# Altium footprint library General.PcbLib: 446 footprints (part 27 of 28)
Each footprint in its own frame and in the unit in brackets; x right, y up, seen from the top. Pads: shape width x height; smd on the part's side, far side on the other; paste and mask are expansions set on the pad; w line width, h text height; cw(c..) or ccw(c..) is an arc to the next point about the centre after c.
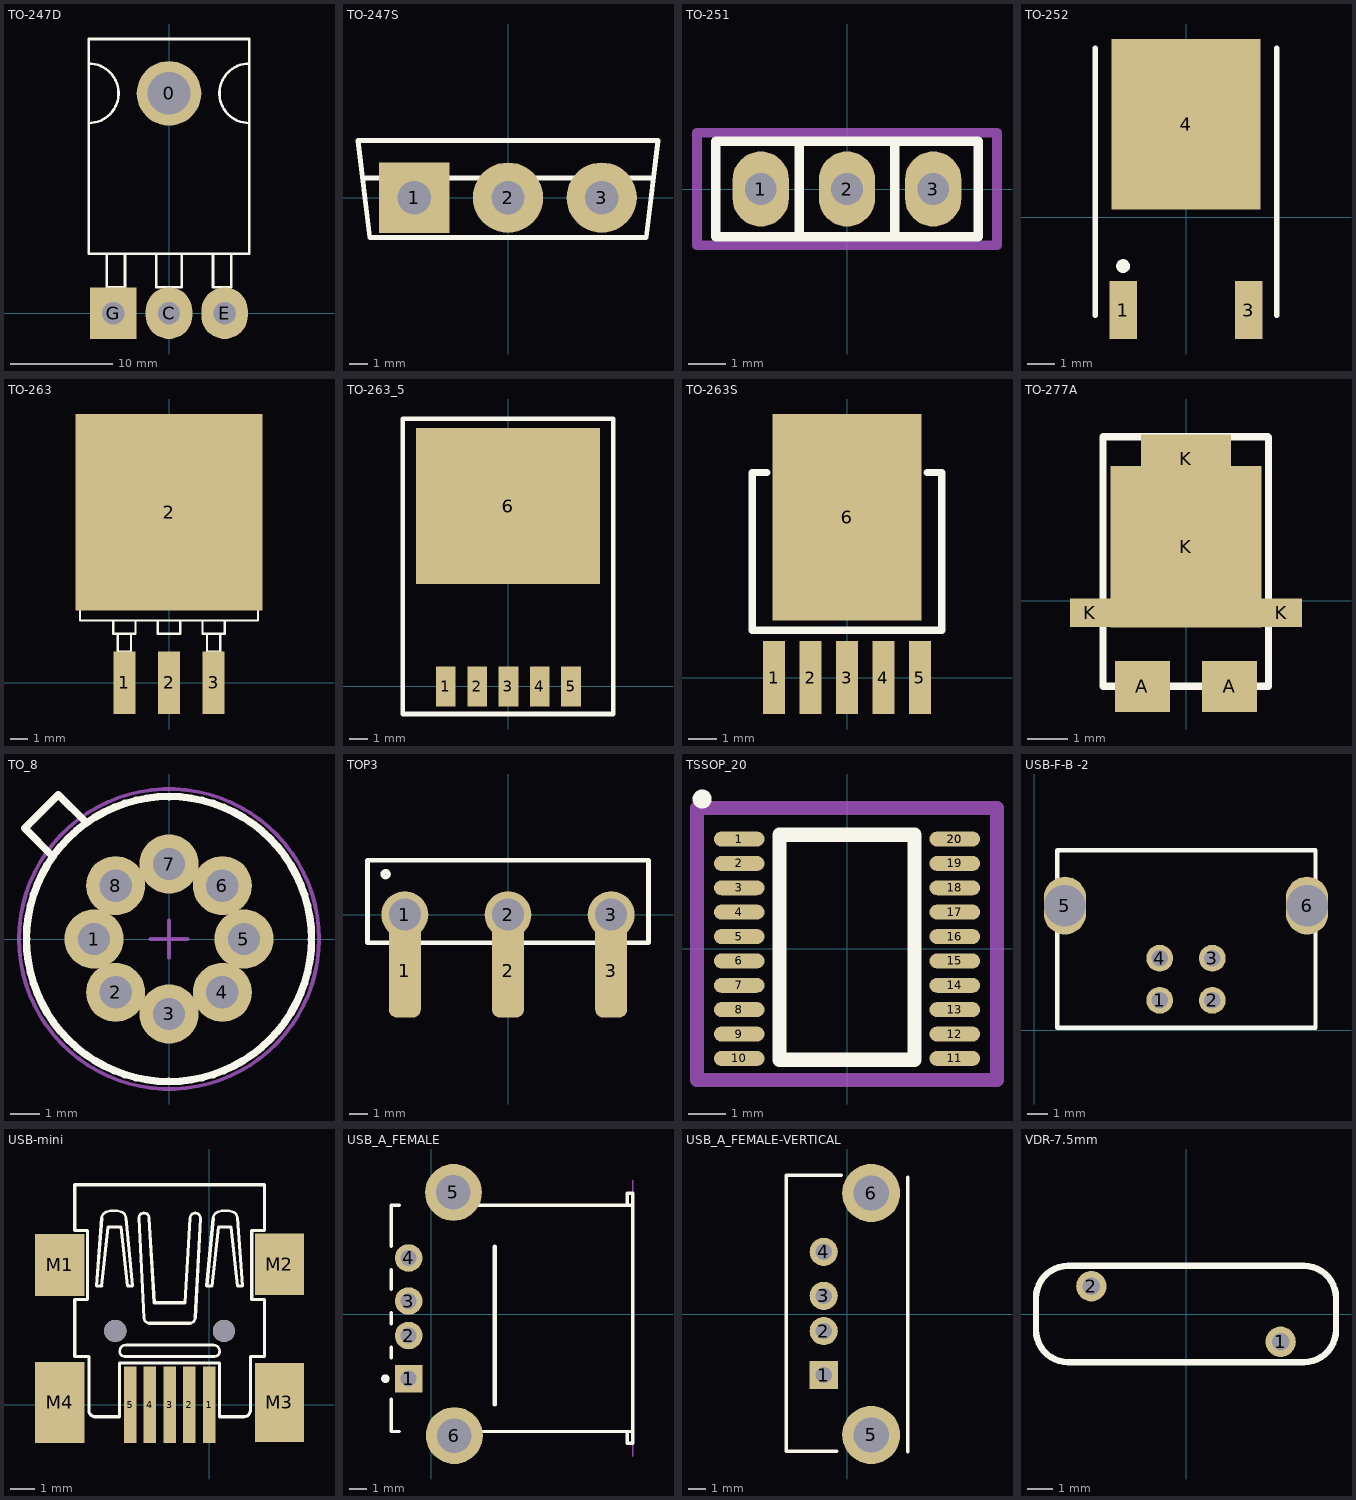
[diagram p26: the footprints below, top view; thin cyan lines are the x and y axes]

## TO-247D [mil]
pads (4):
  round 250 hole 165.35: 0(0,850)
  oval 180x200 hole 86.61: C(0,0) E(215,0)
  rect 180x200 hole 86.61: G(-215,0)
Top Overlay:
  lines w10: -310,735 ccw(c-310,850) -310,965 ; -240,230 -240,100 -170,100 -170,230 ; -50,230 -50,100 50,100 50,230 ; 170,230 170,100 240,100 240,230 ; 310,735 cw(c310,850) 310,965 ; -310,230 -310,1060 310,1060 310,230 -310,230

## TO-247S [mm]
pads (3):
  rect 3.81x3.81 hole 1.8: 1(-5.08,0)
  round 3.81 hole 1.8: 2(0,0) 3(5.08,0)
Top Overlay:
  lines w0.254: -7.885,1.068 7.887,1.068 ; -8.13,3.1 -7.495,-2.16 7.495,-2.16 8.13,3.1 -8.13,3.1

## TO-251 [mm]
pads (3):
  oval 1.5x2 hole 0.85: 1(-2.3,0) 2(0,0) 3(2.3,0)
Top Overlay:
  lines w0.254: -1.27,-1.27 -1.27,1.27 ; 1.27,-1.27 1.27,1.27 ; -3.5,-1.27 3.5,-1.27 3.5,1.27 -3.5,1.27 -3.5,-1.27
Mechanical 15:
  lines w0.254: -4,-1.5 -4,1.5 4,1.5 4,-1.5 -4,-1.5
3D body "TO-251AA(IPak).step": height 9.46, standoff -3.92, extent -3.3,-0.9 3.3,1.4

## TO-252 [mm] "for LM7805CDT-smd"
pads (3):
  rect 1x2.1 smd: 1(-2.285,-3.375) 3(2.285,-3.375)
  rect 5.4x6.2 smd: 4(0,3.375)
Top Overlay:
  circle w0.25: c-2.285,-1.775 r0.125
  lines w0.2: -3.29,-3.568 -3.29,6.132 ; 3.29,-3.568 3.29,6.132
3D body "CircuitWorks-TO-252.step": height 2.3, standoff 0, extent -3.29,-3.568 3.29,6.132

## TO-263 [mil]
pads (4):
  rect 50x140 smd: 1(-100,0) 2(0,0) 3(100,0)
  rect 420x440.94 smd: 2(0,382.83)
Top Overlay:
  lines w5: -125,140 -125,110 -75,110 -75,140 ; -115,110 -115,70 -85,70 -85,110 ; -25,140 -25,110 25,110 25,140 ; 75,140 75,110 125,110 125,140 ; 85,110 85,70 115,70 115,110 ; -200,140 200,140 200,520 200,550 170,565 -170,565 -200,550 -200,520 -200,140
3D body "SW3dPS-TO263-3S.STEP": height 189.36, standoff 0.39, extent -195.21,-43.32 198.49,573.61

## TO-263_5 [mm]
pads (6):
  rect 1.07x2.16 smd: 1(-3.4,0) 2(-1.7,0) 3(0,0) 4(1.7,0) 5(3.4,0)
  rect 10x8.5 smd: 6(-0.025,9.804)
Top Overlay:
  lines w0.254: -5.74,-1.499 -5.74,14.554 5.69,14.554 5.69,-1.499 -5.74,-1.499
3D body "TO263-5S.STEP": height 4.81, standoff 0.01, extent -5.025,-1.064 4.975,14.606

## TO-263S [mil]
pads (6):
  rect 30x100 smd: 1(-100,0) 2(-50,0) 3(0,0) 4(50,0) 5(100,0)
  rect 204.72x283.46 smd: 6(0,220)
Top Overlay:
  lines w10: -109.92,281.54 -129.92,281.54 -129.92,65 129.92,65 129.92,281.54 109.92,281.54

## TO-277A [mm]
pads (6):
  rect 1.35x1.24 smd: A(-1.065,-2.096) A(1.065,-2.096)
  rect 1x0.7 smd: K(-2.337,-0.291) K(2.337,-0.291)
  rect 3.7x3.94 smd: K(0,1.321)
  rect 2.2x1.2 smd: K(0,3.468)
Top Overlay:
  lines w0.178: -2.032,4.013 -2.032,-2.092 2.018,-2.092 2.018,4.002 2.007,4.013 -1.981,4.013

## TO_8 [mm]
pads (8):
  round 2 hole 1.1: 1(-2.54,0) 2(-1.806,-1.806) 3(0,-2.54) 4(1.806,-1.806) 5(2.54,0) 6(1.806,1.806) 7(0,2.54) 8(-1.806,1.806)
Top Overlay:
  circle w0.254: c0,0 r4.826
  lines w0.254: -3.937,2.794 -4.889,3.746 -3.746,4.889 -2.794,3.937
Mechanical 15:
  circle w0.127: c0,0 r5.08
  lines w0.127: -0.635,0 0.635,0 ; 0,-0.635 0,0.635
3D body: height 0.89, standoff 0, extent -4.699,-4.699 0,0
3D body: height 0.89, standoff 0, extent -4.699,0 0,4.699
3D body: height 0.89, standoff 0, extent 0,0 4.699,4.699
3D body: height 0.89, standoff 0, extent 0,-4.699 4.699,0
3D body: height 4.7, standoff 0, extent 0,0 4.064,4.064
3D body: height 4.7, standoff 0, extent -4.064,0 0,4.064
3D body: height 4.7, standoff 0, extent -4.064,-4.064 0,0
3D body: height 4.7, standoff 0, extent 0,-4.064 4.064,0

## TOP3 [mm] "for BTA41"
pads (6):
  rrect50% 1.7x5 smd: 1(-5.5,-3) 2(0,-3) 3(5.5,-3)
  round 2.5 hole 1.7: 1(-5.5,0) 2(0,0) 3(5.5,0)
Top Overlay:
  circle w0.254: c-6.528,2.159 r0.148
  lines w0.254: -7.5,-1.5 -7.5,2.9 7.5,2.9 7.5,-1.5 -7.5,-1.5
3D body "TOP3.step": height 22.9, standoff -13, extent -7.75,-1.448 7.75,3.052

## TSSOP_20 [mm]
pads (21):
  oval 1.35x0.4 smd: 1(-2.875,2.925) 2(-2.875,2.275) 3(-2.875,1.625) 4(-2.875,0.975) 5(-2.875,0.325) 6(-2.875,-0.325) 7(-2.875,-0.975) 8(-2.875,-1.625) 9(-2.875,-2.275) 10(-2.875,-2.925) 11(2.875,-2.925) 12(2.875,-2.275) 13(2.875,-1.625) 14(2.875,-0.975) 15(2.875,-0.325) 16(2.875,0.325) 17(2.875,0.975) 18(2.875,1.625) 19(2.875,2.275) 20(2.875,2.925) 20(2.875,2.925)
Top Overlay:
  circle w0.254: c-3.866,3.992 r0.127
  lines w0.381: -1.8,-2.962 0,-2.962 1.8,-2.962 1.8,0.038 1.8,3.038 0,3.038 -1.8,3.038 -1.8,0.038 -1.8,-2.962
Mechanical 15:
  lines w0.381: -4,-3.5 -3.75,-3.5 4,-3.5 4,3.75 -0.5,3.75 -4,3.75 -4,-3.5
3D body "tssop-20-1.step": height 1.2, standoff 0, extent -3.254,-3.298 3.346,3.302

## USB-F-B -2 [mil]
pads (6):
  round 51 hole 31.5: 1(238.5,56.5) 2(338.5,56.5) 3(338.5,136.5) 4(238.5,136.5)
  oval 80x110 hole 78.74: 5(58.5,236.5) 6(518.5,236.5)
Top Overlay:
  lines w8: 44,4.5 534.5,4.5 534.5,341.5 44,341.5 44,4.5
3D body "User Library-Samtec - USB-B-S-X-W-TH.STEP": height 433.07, standoff -143.42, extent 0.71,0.71 583.33,650.32

## USB-mini [mm]
pads (11):
  rect 0.5x3.1 smd: 1(0,0) 2(-0.8,0) 3(-1.6,0) 4(-2.4,0) 5(-3.2,0)
  rect 2x2.5 smd: M1(-6.05,5.67) M2(2.85,5.695)
  rect 2x3.2 smd: M3(2.85,0.1)
  rect 2x3.3 smd: M4(-6.05,0.1)
  round 0.9 on Top hole 0.9: ""(-3.8,3) ""(0.6,3)
Top Overlay:
  lines w0.102: -4.351,7.569 cw(c-4.057,7.546) -4.144,7.828 cw(c-3.858,6.897) -3.573,7.828 cw(c-3.659,7.546) -3.365,7.569 ; -3.417,1.962 cw(c-3.417,2.169) -3.624,2.17 cw(c-3.365,2.169) -3.365,2.429 ; -2.846,7.569 cw(c-2.638,7.569) -2.638,7.776 cw(c-2.638,7.569) -2.43,7.569 ; -2.638,3.519 ccw(c-2.418,3.531) -2.43,3.312 ; -0.769,3.312 ccw(c-0.781,3.531) -0.562,3.519 ; -0.769,7.569 cw(c-0.562,7.569) -0.562,7.776 cw(c-0.562,7.569) -0.354,7.569 ; 0.165,2.429 cw(c0.165,2.169) 0.425,2.17 cw(c0.217,2.169) 0.217,1.962 ; 0.165,7.569 cw(c0.459,7.546) 0.373,7.828 cw(c0.658,6.897) 0.944,7.828 cw(c0.858,7.546) 1.151,7.569
  lines w0.127: -5.442,1.962 -5.441,4.271 -4.927,4.271 -4.927,7.065 -5.441,7.065 -5.441,8.918 ; -5.435,1.96 -4.87,1.96 -4.87,-0.219 ccw(c-4.611,-0.219) -4.611,-0.478 -3.625,-0.478 -3.625,1.7 0.425,1.7 0.425,-0.477 1.411,-0.477 ; -4.351,7.569 -4.559,4.817 -4.351,4.817 -4.092,7.205 -3.573,7.205 -3.313,4.817 -3.105,4.817 -3.365,7.569 ; -3.417,1.962 0.217,1.962 ; -3.365,2.429 0.165,2.429 ; -2.846,7.568 -2.638,3.519 ; -2.43,3.312 -0.769,3.312 ; -2.43,7.569 -2.223,4.142 -0.977,4.142 -0.769,7.569 ; -0.562,3.519 -0.354,7.568 ; 0.165,7.569 -0.094,4.817 0.113,4.817 0.373,7.205 0.892,7.205 1.151,4.817 1.359,4.817 1.151,7.569 ; 1.411,-0.477 ccw(c1.411,-0.218) 1.671,-0.217 1.671,1.963 ; 1.67,1.96 2.235,1.96 ; 2.241,1.962 2.242,4.271 1.727,4.271 1.727,7.065 2.242,7.065 2.242,8.918 ; 2.241,7.415 2.242,8.918 ; -5.441,8.918 -5.441,8.918 ; -5.441,8.918 2.242,8.918 ; -0.562,7.776 -0.562,7.776 ; 0.425,2.169 0.425,2.17
3D body "User Library-usb_mini_smd.step": height 4.14, standoff -0.95, extent -6.674,-0.31 3.226,8.89

## USB_A_FEMALE [mm]
pads (6):
  rect 1.6x1.6 hole 0.92: 1(-1.325,-3.75)
  round 1.6 hole 0.92: 2(-1.325,-1.25) 3(-1.325,0.75) 4(-1.325,3.25)
  round 3.3 hole 2: 5(1.275,7.05) 6(1.325,-7.05)
Top Overlay:
  circle w0.25: c-2.675,-3.75 r0.125
  lines w0.2: -2.325,-4.95 -2.325,-6.815 -1.875,-6.815 ; -2.325,-2.55 -2.325,-1.92 ; -2.325,-0.58 -2.325,0.08 ; -2.325,1.42 -2.325,2.58 ; -2.325,3.92 -2.325,6.315 -1.875,6.315 ; 2.225,-6.815 11.675,-6.815 ; 2.225,6.315 11.675,6.315 ; 11.355,-6.815 11.355,-7.5 11.675,-7.5 11.675,-6.815 ; 11.355,6.315 11.355,7 11.675,7 11.675,6.315 ; 11.675,-6.815 11.675,6.315
  lines w0.254: 3.675,-5.25 3.675,3.9
Mechanical 1:
  lines w0.1: 11.675,-8.25 11.675,7.75
  text "PCB Edge" at 11.339,-6.553 h0.25
3D body "Samtec-USB-A-S-F-B-TH.STEP": height 2.77, standoff -8.15, extent -2.325,-8.1 11.775,7.699

## USB_A_FEMALE-VERTICAL [mm]
pads (6):
  rect 1.6x1.6 hole 0.92: 1(-1.348,-3.469)
  round 1.6 hole 0.92: 2(-1.348,-0.969) 3(-1.348,1.031) 4(-1.348,3.531)
  round 3.3 hole 2: 5(1.348,-6.871) 6(1.348,6.871)
Top Overlay:
  lines w0.2: -0.61,-7.798 -3.48,-7.798 -3.48,7.874 -0.356,7.874 ; 3.429,-7.823 3.429,7.772
3D body "614004135023.stp": height 14.8, standoff -4, extent -3.458,-7.819 3.382,7.881

## VDR-7.5mm [mm]
pads (2):
  round 1.2 hole 0.7: 1(3.75,-1.1) 2(-3.75,1.1)
Top Overlay:
  lines w0.254: -5.944,-0.635 ccw(c-4.674,-0.635) -4.674,-1.905 0,-1.905 4.674,-1.905 ccw(c4.674,-0.635) 5.944,-0.635 5.944,0 5.944,0.635 ccw(c4.674,0.635) 4.674,1.905 0,1.905 -4.674,1.905 ccw(c-4.674,0.635) -5.944,0.635 -5.944,0 -5.944,-0.635
3D body "vdr8mm.STEP": height 13, standoff -2.5, extent -6,-1.876 6,1.925